# Altium footprint library ST封装.PcbLib: 1336 footprints (part 86 of 109) (continued)
## SQFP28X40-440(N) [mm] (continued)
Top Overlay:
  lines w0.2: -0.4,-39.3 -0.4,-40.45 0.75,-40.45 ; -0.4,0.6 -0.4,0.95 0.4,1.75 0.75,1.75 ; 28.65,-40.45 29.8,-40.45 29.8,-39.3 ; 28.65,1.75 29.8,1.75 29.8,0.6

## SQFP28X40-440(T) [mm]
pads (440):
  rect 0.2x1.6 smd: 1(0,0)
  oval 0.2x1.6 smd: 2(-0.3,0) 3(-0.6,0) 4(-0.9,0) 5(-1.2,0) 6(-1.5,0) 7(-1.8,0) 8(-2.1,0) 9(-2.4,0) 10(-2.7,0) 11(-3,0) 12(-3.3,0) 13(-3.6,0) 14(-3.9,0) 15(-4.2,0) 16(-4.5,0) 17(-4.8,0) 18(-5.1,0) 19(-5.4,0) 20(-5.7,0) 21(-6,0) 22(-6.3,0) 23(-6.6,0) 24(-6.9,0) 25(-7.2,0) 26(-7.5,0) 27(-7.8,0) 28(-8.1,0) 29(-8.4,0) 30(-8.7,0) 31(-9,0) 32(-9.3,0) 33(-9.6,0) 34(-9.9,0) 35(-10.2,0) 36(-10.5,0) 37(-10.8,0) 38(-11.1,0) 39(-11.4,0) 40(-11.7,0) 41(-12,0) 42(-12.3,0) 43(-12.6,0) 44(-12.9,0) 45(-13.2,0) 176(-13.2,-41.4) 177(-12.9,-41.4) 178(-12.6,-41.4) 179(-12.3,-41.4) 180(-12,-41.4) 181(-11.7,-41.4) 182(-11.4,-41.4) 183(-11.1,-41.4) 184(-10.8,-41.4) 185(-10.5,-41.4) 186(-10.2,-41.4) 187(-9.9,-41.4) 188(-9.6,-41.4) 189(-9.3,-41.4) 190(-9,-41.4) 191(-8.7,-41.4) 192(-8.4,-41.4) 193(-8.1,-41.4) 194(-7.8,-41.4) 195(-7.5,-41.4) 196(-7.2,-41.4) 197(-6.9,-41.4) 198(-6.6,-41.4) 199(-6.3,-41.4) 200(-6,-41.4) 201(-5.7,-41.4) 202(-5.4,-41.4) 203(-5.1,-41.4) 204(-4.8,-41.4) 205(-4.5,-41.4) 206(-4.2,-41.4) 207(-3.9,-41.4) 208(-3.6,-41.4) 209(-3.3,-41.4) 210(-3,-41.4) 211(-2.7,-41.4) 212(-2.4,-41.4) 213(-2.1,-41.4) 214(-1.8,-41.4) 215(-1.5,-41.4) 216(-1.2,-41.4) 217(-0.9,-41.4) 218(-0.6,-41.4) 219(-0.3,-41.4) 220(0,-41.4) 221(0.3,-41.4) 222(0.6,-41.4) 223(0.9,-41.4) 224(1.2,-41.4) 225(1.5,-41.4) 226(1.8,-41.4) 227(2.1,-41.4) 228(2.4,-41.4) 229(2.7,-41.4) 230(3,-41.4) 231(3.3,-41.4) 232(3.6,-41.4) 233(3.9,-41.4) 234(4.2,-41.4) 235(4.5,-41.4) 236(4.8,-41.4) 237(5.1,-41.4) 238(5.4,-41.4) 239(5.7,-41.4) 240(6,-41.4) 241(6.3,-41.4) 242(6.6,-41.4) 243(6.9,-41.4) 244(7.2,-41.4) 245(7.5,-41.4) 246(7.8,-41.4) 247(8.1,-41.4) 248(8.4,-41.4) 249(8.7,-41.4) 250(9,-41.4) 251(9.3,-41.4) 252(9.6,-41.4) 253(9.9,-41.4) 254(10.2,-41.4) 255(10.5,-41.4) 256(10.8,-41.4) 257(11.1,-41.4) 258(11.4,-41.4) 259(11.7,-41.4) 260(12,-41.4) 261(12.3,-41.4) 262(12.6,-41.4) 263(12.9,-41.4) 264(13.2,-41.4) 265(13.5,-41.4) 396(13.5,0) 397(13.2,0) 398(12.9,0) 399(12.6,0) 400(12.3,0) 401(12,0) 402(11.7,0) 403(11.4,0) 404(11.1,0) 405(10.8,0) 406(10.5,0) 407(10.2,0) 408(9.9,0) 409(9.6,0) 410(9.3,0) 411(9,0) 412(8.7,0) 413(8.4,0) 414(8.1,0) 415(7.8,0) 416(7.5,0) 417(7.2,0) 418(6.9,0) 419(6.6,0) 420(6.3,0) 421(6,0) 422(5.7,0) 423(5.4,0) 424(5.1,0) 425(4.8,0) 426(4.5,0) 427(4.2,0) 428(3.9,0) 429(3.6,0) 430(3.3,0) 431(3,0) 432(2.7,0) 433(2.4,0) 434(2.1,0) 435(1.8,0) 436(1.5,0) 437(1.2,0) 438(0.9,0) 439(0.6,0) 440(0.3,0)
  oval 1.6x0.2 smd: 46(-14.55,-1.35) 47(-14.55,-1.65) 48(-14.55,-1.95) 49(-14.55,-2.25) 50(-14.55,-2.55) 51(-14.55,-2.85) 52(-14.55,-3.15) 53(-14.55,-3.45) 54(-14.55,-3.75) 55(-14.55,-4.05) 56(-14.55,-4.35) 57(-14.55,-4.65) 58(-14.55,-4.95) 59(-14.55,-5.25) 60(-14.55,-5.55) 61(-14.55,-5.85) 62(-14.55,-6.15) 63(-14.55,-6.45) 64(-14.55,-6.75) 65(-14.55,-7.05) 66(-14.55,-7.35) 67(-14.55,-7.65) 68(-14.55,-7.95) 69(-14.55,-8.25) 70(-14.55,-8.55) 71(-14.55,-8.85) 72(-14.55,-9.15) 73(-14.55,-9.45) 74(-14.55,-9.75) 75(-14.55,-10.05) 76(-14.55,-10.35) 77(-14.55,-10.65) 78(-14.55,-10.95) 79(-14.55,-11.25) 80(-14.55,-11.55) 81(-14.55,-11.85) 82(-14.55,-12.15) 83(-14.55,-12.45) 84(-14.55,-12.75) 85(-14.55,-13.05) 86(-14.55,-13.35) 87(-14.55,-13.65) 88(-14.55,-13.95) 89(-14.55,-14.25) 90(-14.55,-14.55) 91(-14.55,-14.85) 92(-14.55,-15.15) 93(-14.55,-15.45) 94(-14.55,-15.75) 95(-14.55,-16.05) 96(-14.55,-16.35) 97(-14.55,-16.65) 98(-14.55,-16.95) 99(-14.55,-17.25) 100(-14.55,-17.55) 101(-14.55,-17.85) 102(-14.55,-18.15) 103(-14.55,-18.45) 104(-14.55,-18.75) 105(-14.55,-19.05) 106(-14.55,-19.35) 107(-14.55,-19.65) 108(-14.55,-19.95) 109(-14.55,-20.25) 110(-14.55,-20.55) 111(-14.55,-20.85) 112(-14.55,-21.15) 113(-14.55,-21.45) 114(-14.55,-21.75) 115(-14.55,-22.05) 116(-14.55,-22.35) 117(-14.55,-22.65) 118(-14.55,-22.95) 119(-14.55,-23.25) 120(-14.55,-23.55) 121(-14.55,-23.85) 122(-14.55,-24.15) 123(-14.55,-24.45) 124(-14.55,-24.75) 125(-14.55,-25.05) 126(-14.55,-25.35) 127(-14.55,-25.65) 128(-14.55,-25.95) 129(-14.55,-26.25) 130(-14.55,-26.55) 131(-14.55,-26.85) 132(-14.55,-27.15) 133(-14.55,-27.45) 134(-14.55,-27.75) 135(-14.55,-28.05) 136(-14.55,-28.35) 137(-14.55,-28.65) 138(-14.55,-28.95) 139(-14.55,-29.25) 140(-14.55,-29.55) 141(-14.55,-29.85) 142(-14.55,-30.15) 143(-14.55,-30.45) 144(-14.55,-30.75) 145(-14.55,-31.05) 146(-14.55,-31.35) 147(-14.55,-31.65) 148(-14.55,-31.95) 149(-14.55,-32.25) 150(-14.55,-32.55) 151(-14.55,-32.85) 152(-14.55,-33.15) 153(-14.55,-33.45) 154(-14.55,-33.75) 155(-14.55,-34.05) 156(-14.55,-34.35) 157(-14.55,-34.65) 158(-14.55,-34.95) 159(-14.55,-35.25) 160(-14.55,-35.55) 161(-14.55,-35.85) 162(-14.55,-36.15) 163(-14.55,-36.45) 164(-14.55,-36.75) 165(-14.55,-37.05) 166(-14.55,-37.35) 167(-14.55,-37.65) 168(-14.55,-37.95) 169(-14.55,-38.25) 170(-14.55,-38.55) 171(-14.55,-38.85) 172(-14.55,-39.15) 173(-14.55,-39.45) 174(-14.55,-39.75) 175(-14.55,-40.05) 266(14.85,-40.05) 267(14.85,-39.75) 268(14.85,-39.45) 269(14.85,-39.15) 270(14.85,-38.85) 271(14.85,-38.55) 272(14.85,-38.25) 273(14.85,-37.95) 274(14.85,-37.65) 275(14.85,-37.35) 276(14.85,-37.05) 277(14.85,-36.75) 278(14.85,-36.45) 279(14.85,-36.15) 280(14.85,-35.85) 281(14.85,-35.55) 282(14.85,-35.25) 283(14.85,-34.95) 284(14.85,-34.65) 285(14.85,-34.35) 286(14.85,-34.05) 287(14.85,-33.75) 288(14.85,-33.45) 289(14.85,-33.15) 290(14.85,-32.85) 291(14.85,-32.55) 292(14.85,-32.25) 293(14.85,-31.95) 294(14.85,-31.65) 295(14.85,-31.35) 296(14.85,-31.05) 297(14.85,-30.75) 298(14.85,-30.45) 299(14.85,-30.15) 300(14.85,-29.85) 301(14.85,-29.55) 302(14.85,-29.25) 303(14.85,-28.95) 304(14.85,-28.65) 305(14.85,-28.35) 306(14.85,-28.05) 307(14.85,-27.75) 308(14.85,-27.45) 309(14.85,-27.15) 310(14.85,-26.85) 311(14.85,-26.55) 312(14.85,-26.25) 313(14.85,-25.95) 314(14.85,-25.65) 315(14.85,-25.35) 316(14.85,-25.05) 317(14.85,-24.75) 318(14.85,-24.45) 319(14.85,-24.15) 320(14.85,-23.85) 321(14.85,-23.55) 322(14.85,-23.25) 323(14.85,-22.95) 324(14.85,-22.65) 325(14.85,-22.35) 326(14.85,-22.05) 327(14.85,-21.75) 328(14.85,-21.45) 329(14.85,-21.15) 330(14.85,-20.85) 331(14.85,-20.55) 332(14.85,-20.25) 333(14.85,-19.95) 334(14.85,-19.65) 335(14.85,-19.35) 336(14.85,-19.05) 337(14.85,-18.75) 338(14.85,-18.45) 339(14.85,-18.15) 340(14.85,-17.85) 341(14.85,-17.55) 342(14.85,-17.25) 343(14.85,-16.95) 344(14.85,-16.65) 345(14.85,-16.35) 346(14.85,-16.05) 347(14.85,-15.75) 348(14.85,-15.45) 349(14.85,-15.15) 350(14.85,-14.85) 351(14.85,-14.55) 352(14.85,-14.25) 353(14.85,-13.95) 354(14.85,-13.65) 355(14.85,-13.35) 356(14.85,-13.05) 357(14.85,-12.75) 358(14.85,-12.45) 359(14.85,-12.15) 360(14.85,-11.85) 361(14.85,-11.55) 362(14.85,-11.25) 363(14.85,-10.95) 364(14.85,-10.65) 365(14.85,-10.35) 366(14.85,-10.05) 367(14.85,-9.75) 368(14.85,-9.45) 369(14.85,-9.15) 370(14.85,-8.85) 371(14.85,-8.55) 372(14.85,-8.25) 373(14.85,-7.95) 374(14.85,-7.65) 375(14.85,-7.35) 376(14.85,-7.05) 377(14.85,-6.75) 378(14.85,-6.45) 379(14.85,-6.15) 380(14.85,-5.85) 381(14.85,-5.55) 382(14.85,-5.25) 383(14.85,-4.95) 384(14.85,-4.65) 385(14.85,-4.35) 386(14.85,-4.05) 387(14.85,-3.75) 388(14.85,-3.45) 389(14.85,-3.15) 390(14.85,-2.85) 391(14.85,-2.55) 392(14.85,-2.25) 393(14.85,-1.95) 394(14.85,-1.65) 395(14.85,-1.35)
Top Overlay:
  lines w0.2: -14.95,-40.65 -14.95,-41.8 -13.8,-41.8 ; -14.95,-0.75 -14.95,-0.4 -14.15,0.4 -13.8,0.4 ; 14.1,-41.8 15.25,-41.8 15.25,-40.65 ; 14.1,0.4 15.25,0.4 15.25,-0.75

## SQFP32X32-240(N) [mm]
pads (240):
  rect 1.6x0.4 smd: 1(0,0)
  oval 1.6x0.4 smd: 2(0,-0.5) 3(0,-1) 4(0,-1.5) 5(0,-2) 6(0,-2.5) 7(0,-3) 8(0,-3.5) 9(0,-4) 10(0,-4.5) 11(0,-5) 12(0,-5.5) 13(0,-6) 14(0,-6.5) 15(0,-7) 16(0,-7.5) 17(0,-8) 18(0,-8.5) 19(0,-9) 20(0,-9.5) 21(0,-10) 22(0,-10.5) 23(0,-11) 24(0,-11.5) 25(0,-12) 26(0,-12.5) 27(0,-13) 28(0,-13.5) 29(0,-14) 30(0,-14.5) 31(0,-15) 32(0,-15.5) 33(0,-16) 34(0,-16.5) 35(0,-17) 36(0,-17.5) 37(0,-18) 38(0,-18.5) 39(0,-19) 40(0,-19.5) 41(0,-20) 42(0,-20.5) 43(0,-21) 44(0,-21.5) 45(0,-22) 46(0,-22.5) 47(0,-23) 48(0,-23.5) 49(0,-24) 50(0,-24.5) 51(0,-25) 52(0,-25.5) 53(0,-26) 54(0,-26.5) 55(0,-27) 56(0,-27.5) 57(0,-28) 58(0,-28.5) 59(0,-29) 60(0,-29.5) 121(33.4,-29.5) 122(33.4,-29) 123(33.4,-28.5) 124(33.4,-28) 125(33.4,-27.5) 126(33.4,-27) 127(33.4,-26.5) 128(33.4,-26) 129(33.4,-25.5) 130(33.4,-25) 131(33.4,-24.5) 132(33.4,-24) 133(33.4,-23.5) 134(33.4,-23) 135(33.4,-22.5) 136(33.4,-22) 137(33.4,-21.5) 138(33.4,-21) 139(33.4,-20.5) 140(33.4,-20) 141(33.4,-19.5) 142(33.4,-19) 143(33.4,-18.5) 144(33.4,-18) 145(33.4,-17.5) 146(33.4,-17) 147(33.4,-16.5) 148(33.4,-16) 149(33.4,-15.5) 150(33.4,-15) 151(33.4,-14.5) 152(33.4,-14) 153(33.4,-13.5) 154(33.4,-13) 155(33.4,-12.5) 156(33.4,-12) 157(33.4,-11.5) 158(33.4,-11) 159(33.4,-10.5) 160(33.4,-10) 161(33.4,-9.5) 162(33.4,-9) 163(33.4,-8.5) 164(33.4,-8) 165(33.4,-7.5) 166(33.4,-7) 167(33.4,-6.5) 168(33.4,-6) 169(33.4,-5.5) 170(33.4,-5) 171(33.4,-4.5) 172(33.4,-4) 173(33.4,-3.5) 174(33.4,-3) 175(33.4,-2.5) 176(33.4,-2) 177(33.4,-1.5) 178(33.4,-1) 179(33.4,-0.5) 180(33.4,0)
  oval 0.4x1.6 smd: 61(1.95,-31.45) 62(2.45,-31.45) 63(2.95,-31.45) 64(3.45,-31.45) 65(3.95,-31.45) 66(4.45,-31.45) 67(4.95,-31.45) 68(5.45,-31.45) 69(5.95,-31.45) 70(6.45,-31.45) 71(6.95,-31.45) 72(7.45,-31.45) 73(7.95,-31.45) 74(8.45,-31.45) 75(8.95,-31.45) 76(9.45,-31.45) 77(9.95,-31.45) 78(10.45,-31.45) 79(10.95,-31.45) 80(11.45,-31.45) 81(11.95,-31.45) 82(12.45,-31.45) 83(12.95,-31.45) 84(13.45,-31.45) 85(13.95,-31.45) 86(14.45,-31.45) 87(14.95,-31.45) 88(15.45,-31.45) 89(15.95,-31.45) 90(16.45,-31.45) 91(16.95,-31.45) 92(17.45,-31.45) 93(17.95,-31.45) 94(18.45,-31.45) 95(18.95,-31.45) 96(19.45,-31.45) 97(19.95,-31.45) 98(20.45,-31.45) 99(20.95,-31.45) 100(21.45,-31.45) 101(21.95,-31.45) 102(22.45,-31.45) 103(22.95,-31.45) 104(23.45,-31.45) 105(23.95,-31.45) 106(24.45,-31.45) 107(24.95,-31.45) 108(25.45,-31.45) 109(25.95,-31.45) 110(26.45,-31.45) 111(26.95,-31.45) 112(27.45,-31.45) 113(27.95,-31.45) 114(28.45,-31.45) 115(28.95,-31.45) 116(29.45,-31.45) 117(29.95,-31.45) 118(30.45,-31.45) 119(30.95,-31.45) 120(31.45,-31.45) 181(31.45,1.95) 182(30.95,1.95) 183(30.45,1.95) 184(29.95,1.95) 185(29.45,1.95) 186(28.95,1.95) 187(28.45,1.95) 188(27.95,1.95) 189(27.45,1.95) 190(26.95,1.95) 191(26.45,1.95) 192(25.95,1.95) 193(25.45,1.95) 194(24.95,1.95) 195(24.45,1.95) 196(23.95,1.95) 197(23.45,1.95) 198(22.95,1.95) 199(22.45,1.95) 200(21.95,1.95) 201(21.45,1.95) 202(20.95,1.95) 203(20.45,1.95) 204(19.95,1.95) 205(19.45,1.95) 206(18.95,1.95) 207(18.45,1.95) 208(17.95,1.95) 209(17.45,1.95) 210(16.95,1.95) 211(16.45,1.95) 212(15.95,1.95) 213(15.45,1.95) 214(14.95,1.95) 215(14.45,1.95) 216(13.95,1.95) 217(13.45,1.95) 218(12.95,1.95) 219(12.45,1.95) 220(11.95,1.95) 221(11.45,1.95) 222(10.95,1.95) 223(10.45,1.95) 224(9.95,1.95) 225(9.45,1.95) 226(8.95,1.95) 227(8.45,1.95) 228(7.95,1.95) 229(7.45,1.95) 230(6.95,1.95) 231(6.45,1.95) 232(5.95,1.95) 233(5.45,1.95) 234(4.95,1.95) 235(4.45,1.95) 236(3.95,1.95) 237(3.45,1.95) 238(2.95,1.95) 239(2.45,1.95) 240(1.95,1.95)
Top Overlay:
  lines w0.2: -0.4,-30.2 -0.4,-31.85 1.25,-31.85 ; -0.4,0.7 -0.4,1.55 0.4,2.35 1.25,2.35 ; 32.15,-31.85 33.8,-31.85 33.8,-30.2 ; 32.15,2.35 33.8,2.35 33.8,0.7

## SQFP32X32-240(T) [mm]
pads (240):
  rect 0.4x1.6 smd: 1(0,0)
  oval 0.4x1.6 smd: 2(-0.5,0) 3(-1,0) 4(-1.5,0) 5(-2,0) 6(-2.5,0) 7(-3,0) 8(-3.5,0) 9(-4,0) 10(-4.5,0) 11(-5,0) 12(-5.5,0) 13(-6,0) 14(-6.5,0) 15(-7,0) 16(-7.5,0) 17(-8,0) 18(-8.5,0) 19(-9,0) 20(-9.5,0) 21(-10,0) 22(-10.5,0) 23(-11,0) 24(-11.5,0) 25(-12,0) 26(-12.5,0) 27(-13,0) 28(-13.5,0) 29(-14,0) 30(-14.5,0) 91(-14.5,-33.4) 92(-14,-33.4) 93(-13.5,-33.4) 94(-13,-33.4) 95(-12.5,-33.4) 96(-12,-33.4) 97(-11.5,-33.4) 98(-11,-33.4) 99(-10.5,-33.4) 100(-10,-33.4) 101(-9.5,-33.4) 102(-9,-33.4) 103(-8.5,-33.4) 104(-8,-33.4) 105(-7.5,-33.4) 106(-7,-33.4) 107(-6.5,-33.4) 108(-6,-33.4) 109(-5.5,-33.4) 110(-5,-33.4) 111(-4.5,-33.4) 112(-4,-33.4) 113(-3.5,-33.4) 114(-3,-33.4) 115(-2.5,-33.4) 116(-2,-33.4) 117(-1.5,-33.4) 118(-1,-33.4) 119(-0.5,-33.4) 120(0,-33.4) 121(0.5,-33.4) 122(1,-33.4) 123(1.5,-33.4) 124(2,-33.4) 125(2.5,-33.4) 126(3,-33.4) 127(3.5,-33.4) 128(4,-33.4) 129(4.5,-33.4) 130(5,-33.4) 131(5.5,-33.4) 132(6,-33.4) 133(6.5,-33.4) 134(7,-33.4) 135(7.5,-33.4) 136(8,-33.4) 137(8.5,-33.4) 138(9,-33.4) 139(9.5,-33.4) 140(10,-33.4) 141(10.5,-33.4) 142(11,-33.4) 143(11.5,-33.4) 144(12,-33.4) 145(12.5,-33.4) 146(13,-33.4) 147(13.5,-33.4) 148(14,-33.4) 149(14.5,-33.4) 150(15,-33.4) 211(15,0) 212(14.5,0) 213(14,0) 214(13.5,0) 215(13,0) 216(12.5,0) 217(12,0) 218(11.5,0) 219(11,0) 220(10.5,0) 221(10,0) 222(9.5,0) 223(9,0) 224(8.5,0) 225(8,0) 226(7.5,0) 227(7,0) 228(6.5,0) 229(6,0) 230(5.5,0) 231(5,0) 232(4.5,0) 233(4,0) 234(3.5,0) 235(3,0) 236(2.5,0) 237(2,0) 238(1.5,0) 239(1,0) 240(0.5,0)
  oval 1.6x0.4 smd: 31(-16.45,-1.95) 32(-16.45,-2.45) 33(-16.45,-2.95) 34(-16.45,-3.45) 35(-16.45,-3.95) 36(-16.45,-4.45) 37(-16.45,-4.95) 38(-16.45,-5.45) 39(-16.45,-5.95) 40(-16.45,-6.45) 41(-16.45,-6.95) 42(-16.45,-7.45) 43(-16.45,-7.95) 44(-16.45,-8.45) 45(-16.45,-8.95) 46(-16.45,-9.45) 47(-16.45,-9.95) 48(-16.45,-10.45) 49(-16.45,-10.95) 50(-16.45,-11.45) 51(-16.45,-11.95) 52(-16.45,-12.45) 53(-16.45,-12.95) 54(-16.45,-13.45) 55(-16.45,-13.95) 56(-16.45,-14.45) 57(-16.45,-14.95) 58(-16.45,-15.45) 59(-16.45,-15.95) 60(-16.45,-16.45) 61(-16.45,-16.95) 62(-16.45,-17.45) 63(-16.45,-17.95) 64(-16.45,-18.45) 65(-16.45,-18.95) 66(-16.45,-19.45) 67(-16.45,-19.95) 68(-16.45,-20.45) 69(-16.45,-20.95) 70(-16.45,-21.45) 71(-16.45,-21.95) 72(-16.45,-22.45) 73(-16.45,-22.95) 74(-16.45,-23.45) 75(-16.45,-23.95) 76(-16.45,-24.45) 77(-16.45,-24.95) 78(-16.45,-25.45) 79(-16.45,-25.95) 80(-16.45,-26.45) 81(-16.45,-26.95) 82(-16.45,-27.45) 83(-16.45,-27.95) 84(-16.45,-28.45) 85(-16.45,-28.95) 86(-16.45,-29.45) 87(-16.45,-29.95) 88(-16.45,-30.45) 89(-16.45,-30.95) 90(-16.45,-31.45) 151(16.95,-31.45) 152(16.95,-30.95) 153(16.95,-30.45) 154(16.95,-29.95) 155(16.95,-29.45) 156(16.95,-28.95) 157(16.95,-28.45) 158(16.95,-27.95) 159(16.95,-27.45) 160(16.95,-26.95) 161(16.95,-26.45) 162(16.95,-25.95) 163(16.95,-25.45) 164(16.95,-24.95) 165(16.95,-24.45) 166(16.95,-23.95) 167(16.95,-23.45) 168(16.95,-22.95) 169(16.95,-22.45) 170(16.95,-21.95) 171(16.95,-21.45) 172(16.95,-20.95) 173(16.95,-20.45) 174(16.95,-19.95) 175(16.95,-19.45) 176(16.95,-18.95) 177(16.95,-18.45) 178(16.95,-17.95) 179(16.95,-17.45) 180(16.95,-16.95) 181(16.95,-16.45) 182(16.95,-15.95) 183(16.95,-15.45) 184(16.95,-14.95) 185(16.95,-14.45) 186(16.95,-13.95) 187(16.95,-13.45) 188(16.95,-12.95) 189(16.95,-12.45) 190(16.95,-11.95) 191(16.95,-11.45) 192(16.95,-10.95) 193(16.95,-10.45) 194(16.95,-9.95) 195(16.95,-9.45) 196(16.95,-8.95) 197(16.95,-8.45) 198(16.95,-7.95) 199(16.95,-7.45) 200(16.95,-6.95) 201(16.95,-6.45) 202(16.95,-5.95) 203(16.95,-5.45) 204(16.95,-4.95) 205(16.95,-4.45) 206(16.95,-3.95) 207(16.95,-3.45) 208(16.95,-2.95) 209(16.95,-2.45) 210(16.95,-1.95)
Top Overlay:
  lines w0.2: -16.85,-32.15 -16.85,-33.8 -15.2,-33.8 ; -16.85,-1.25 -16.85,-0.4 -16.05,0.4 -15.2,0.4 ; 15.7,-33.8 17.35,-33.8 17.35,-32.15 ; 15.7,0.4 17.35,0.4 17.35,-1.25

## SQFP32X32-248(N) [mm]
pads (248):
  rect 1.6x0.4 smd: 1(0,0)
  oval 1.6x0.4 smd: 2(0,-0.5) 3(0,-1) 4(0,-1.5) 5(0,-2) 6(0,-2.5) 7(0,-3) 8(0,-3.5) 9(0,-4) 10(0,-4.5) 11(0,-5) 12(0,-5.5) 13(0,-6) 14(0,-6.5) 15(0,-7) 16(0,-7.5) 17(0,-8) 18(0,-8.5) 19(0,-9) 20(0,-9.5) 21(0,-10) 22(0,-10.5) 23(0,-11) 24(0,-11.5) 25(0,-12) 26(0,-12.5) 27(0,-13) 28(0,-13.5) 29(0,-14) 30(0,-14.5) 31(0,-15) 32(0,-15.5) 33(0,-16) 34(0,-16.5) 35(0,-17) 36(0,-17.5) 37(0,-18) 38(0,-18.5) 39(0,-19) 40(0,-19.5) 41(0,-20) 42(0,-20.5) 43(0,-21) 44(0,-21.5) 45(0,-22) 46(0,-22.5) 47(0,-23) 48(0,-23.5) 49(0,-24) 50(0,-24.5) 51(0,-25) 52(0,-25.5) 53(0,-26) 54(0,-26.5) 55(0,-27) 56(0,-27.5) 57(0,-28) 58(0,-28.5) 59(0,-29) 60(0,-29.5) 61(0,-30) 62(0,-30.5) 125(33.4,-30.5) 126(33.4,-30) 127(33.4,-29.5) 128(33.4,-29) 129(33.4,-28.5) 130(33.4,-28) 131(33.4,-27.5) 132(33.4,-27) 133(33.4,-26.5) 134(33.4,-26) 135(33.4,-25.5) 136(33.4,-25) 137(33.4,-24.5) 138(33.4,-24) 139(33.4,-23.5) 140(33.4,-23) 141(33.4,-22.5) 142(33.4,-22) 143(33.4,-21.5) 144(33.4,-21) 145(33.4,-20.5) 146(33.4,-20) 147(33.4,-19.5) 148(33.4,-19) 149(33.4,-18.5) 150(33.4,-18) 151(33.4,-17.5) 152(33.4,-17) 153(33.4,-16.5) 154(33.4,-16) 155(33.4,-15.5) 156(33.4,-15) 157(33.4,-14.5) 158(33.4,-14) 159(33.4,-13.5) 160(33.4,-13) 161(33.4,-12.5) 162(33.4,-12) 163(33.4,-11.5) 164(33.4,-11) 165(33.4,-10.5) 166(33.4,-10) 167(33.4,-9.5) 168(33.4,-9) 169(33.4,-8.5) 170(33.4,-8) 171(33.4,-7.5) 172(33.4,-7) 173(33.4,-6.5) 174(33.4,-6) 175(33.4,-5.5) 176(33.4,-5) 177(33.4,-4.5) 178(33.4,-4) 179(33.4,-3.5) 180(33.4,-3) 181(33.4,-2.5) 182(33.4,-2) 183(33.4,-1.5) 184(33.4,-1) 185(33.4,-0.5) 186(33.4,0)
  oval 0.4x1.6 smd: 63(1.45,-31.95) 64(1.95,-31.95) 65(2.45,-31.95) 66(2.95,-31.95) 67(3.45,-31.95) 68(3.95,-31.95) 69(4.45,-31.95) 70(4.95,-31.95) 71(5.45,-31.95) 72(5.95,-31.95) 73(6.45,-31.95) 74(6.95,-31.95) 75(7.45,-31.95) 76(7.95,-31.95) 77(8.45,-31.95) 78(8.95,-31.95) 79(9.45,-31.95) 80(9.95,-31.95) 81(10.45,-31.95) 82(10.95,-31.95) 83(11.45,-31.95) 84(11.95,-31.95) 85(12.45,-31.95) 86(12.95,-31.95) 87(13.45,-31.95) 88(13.95,-31.95) 89(14.45,-31.95) 90(14.95,-31.95) 91(15.45,-31.95) 92(15.95,-31.95) 93(16.45,-31.95) 94(16.95,-31.95) 95(17.45,-31.95) 96(17.95,-31.95) 97(18.45,-31.95) 98(18.95,-31.95) 99(19.45,-31.95) 100(19.95,-31.95) 101(20.45,-31.95) 102(20.95,-31.95) 103(21.45,-31.95) 104(21.95,-31.95) 105(22.45,-31.95) 106(22.95,-31.95) 107(23.45,-31.95) 108(23.95,-31.95) 109(24.45,-31.95) 110(24.95,-31.95) 111(25.45,-31.95) 112(25.95,-31.95) 113(26.45,-31.95) 114(26.95,-31.95) 115(27.45,-31.95) 116(27.95,-31.95) 117(28.45,-31.95) 118(28.95,-31.95) 119(29.45,-31.95) 120(29.95,-31.95) 121(30.45,-31.95) 122(30.95,-31.95) 123(31.45,-31.95) 124(31.95,-31.95) 187(31.95,1.45) 188(31.45,1.45) 189(30.95,1.45) 190(30.45,1.45) 191(29.95,1.45) 192(29.45,1.45) 193(28.95,1.45) 194(28.45,1.45) 195(27.95,1.45) 196(27.45,1.45) 197(26.95,1.45) 198(26.45,1.45) 199(25.95,1.45) 200(25.45,1.45) 201(24.95,1.45) 202(24.45,1.45) 203(23.95,1.45) 204(23.45,1.45) 205(22.95,1.45) 206(22.45,1.45) 207(21.95,1.45) 208(21.45,1.45) 209(20.95,1.45) 210(20.45,1.45) 211(19.95,1.45) 212(19.45,1.45) 213(18.95,1.45) 214(18.45,1.45) 215(17.95,1.45) 216(17.45,1.45) 217(16.95,1.45) 218(16.45,1.45) 219(15.95,1.45) 220(15.45,1.45) 221(14.95,1.45) 222(14.45,1.45) 223(13.95,1.45) 224(13.45,1.45) 225(12.95,1.45) 226(12.45,1.45) 227(11.95,1.45) 228(11.45,1.45) 229(10.95,1.45) 230(10.45,1.45) 231(9.95,1.45) 232(9.45,1.45) 233(8.95,1.45) 234(8.45,1.45) 235(7.95,1.45) 236(7.45,1.45) 237(6.95,1.45) 238(6.45,1.45) 239(5.95,1.45) 240(5.45,1.45) 241(4.95,1.45) 242(4.45,1.45) 243(3.95,1.45) 244(3.45,1.45) 245(2.95,1.45) 246(2.45,1.45) 247(1.95,1.45) 248(1.45,1.45)
Top Overlay:
  lines w0.2: -0.4,-31.2 -0.4,-32.35 0.75,-32.35 ; -0.4,0.7 -0.4,1.05 0.4,1.85 0.75,1.85 ; 32.65,-32.35 33.8,-32.35 33.8,-31.2 ; 32.65,1.85 33.8,1.85 33.8,0.7

## SQFP32X32-248(T) [mm]
pads (248):
  rect 0.4x1.6 smd: 1(0,0)
  oval 0.4x1.6 smd: 2(-0.5,0) 3(-1,0) 4(-1.5,0) 5(-2,0) 6(-2.5,0) 7(-3,0) 8(-3.5,0) 9(-4,0) 10(-4.5,0) 11(-5,0) 12(-5.5,0) 13(-6,0) 14(-6.5,0) 15(-7,0) 16(-7.5,0) 17(-8,0) 18(-8.5,0) 19(-9,0) 20(-9.5,0) 21(-10,0) 22(-10.5,0) 23(-11,0) 24(-11.5,0) 25(-12,0) 26(-12.5,0) 27(-13,0) 28(-13.5,0) 29(-14,0) 30(-14.5,0) 31(-15,0) 94(-15,-33.4) 95(-14.5,-33.4) 96(-14,-33.4) 97(-13.5,-33.4) 98(-13,-33.4) 99(-12.5,-33.4) 100(-12,-33.4) 101(-11.5,-33.4) 102(-11,-33.4) 103(-10.5,-33.4) 104(-10,-33.4) 105(-9.5,-33.4) 106(-9,-33.4) 107(-8.5,-33.4) 108(-8,-33.4) 109(-7.5,-33.4) 110(-7,-33.4) 111(-6.5,-33.4) 112(-6,-33.4) 113(-5.5,-33.4) 114(-5,-33.4) 115(-4.5,-33.4) 116(-4,-33.4) 117(-3.5,-33.4) 118(-3,-33.4) 119(-2.5,-33.4) 120(-2,-33.4) 121(-1.5,-33.4) 122(-1,-33.4) 123(-0.5,-33.4) 124(0,-33.4) 125(0.5,-33.4) 126(1,-33.4) 127(1.5,-33.4) 128(2,-33.4) 129(2.5,-33.4) 130(3,-33.4) 131(3.5,-33.4) 132(4,-33.4) 133(4.5,-33.4) 134(5,-33.4) 135(5.5,-33.4) 136(6,-33.4) 137(6.5,-33.4) 138(7,-33.4) 139(7.5,-33.4) 140(8,-33.4) 141(8.5,-33.4) 142(9,-33.4) 143(9.5,-33.4) 144(10,-33.4) 145(10.5,-33.4) 146(11,-33.4) 147(11.5,-33.4) 148(12,-33.4) 149(12.5,-33.4) 150(13,-33.4) 151(13.5,-33.4) 152(14,-33.4) 153(14.5,-33.4) 154(15,-33.4) 155(15.5,-33.4) 218(15.5,0) 219(15,0) 220(14.5,0) 221(14,0) 222(13.5,0) 223(13,0) 224(12.5,0) 225(12,0) 226(11.5,0) 227(11,0) 228(10.5,0) 229(10,0) 230(9.5,0) 231(9,0) 232(8.5,0) 233(8,0) 234(7.5,0) 235(7,0) 236(6.5,0) 237(6,0) 238(5.5,0) 239(5,0) 240(4.5,0) 241(4,0) 242(3.5,0) 243(3,0) 244(2.5,0) 245(2,0) 246(1.5,0) 247(1,0) 248(0.5,0)
  oval 1.6x0.4 smd: 32(-16.45,-1.45) 33(-16.45,-1.95) 34(-16.45,-2.45) 35(-16.45,-2.95) 36(-16.45,-3.45) 37(-16.45,-3.95) 38(-16.45,-4.45) 39(-16.45,-4.95) 40(-16.45,-5.45) 41(-16.45,-5.95) 42(-16.45,-6.45) 43(-16.45,-6.95) 44(-16.45,-7.45) 45(-16.45,-7.95) 46(-16.45,-8.45) 47(-16.45,-8.95) 48(-16.45,-9.45) 49(-16.45,-9.95) 50(-16.45,-10.45) 51(-16.45,-10.95) 52(-16.45,-11.45) 53(-16.45,-11.95) 54(-16.45,-12.45) 55(-16.45,-12.95) 56(-16.45,-13.45) 57(-16.45,-13.95) 58(-16.45,-14.45) 59(-16.45,-14.95) 60(-16.45,-15.45) 61(-16.45,-15.95) 62(-16.45,-16.45) 63(-16.45,-16.95) 64(-16.45,-17.45) 65(-16.45,-17.95) 66(-16.45,-18.45) 67(-16.45,-18.95) 68(-16.45,-19.45) 69(-16.45,-19.95) 70(-16.45,-20.45) 71(-16.45,-20.95) 72(-16.45,-21.45) 73(-16.45,-21.95) 74(-16.45,-22.45) 75(-16.45,-22.95) 76(-16.45,-23.45) 77(-16.45,-23.95) 78(-16.45,-24.45) 79(-16.45,-24.95) 80(-16.45,-25.45) 81(-16.45,-25.95) 82(-16.45,-26.45) 83(-16.45,-26.95) 84(-16.45,-27.45) 85(-16.45,-27.95) 86(-16.45,-28.45) 87(-16.45,-28.95) 88(-16.45,-29.45) 89(-16.45,-29.95) 90(-16.45,-30.45) 91(-16.45,-30.95) 92(-16.45,-31.45) 93(-16.45,-31.95) 156(16.95,-31.95) 157(16.95,-31.45) 158(16.95,-30.95) 159(16.95,-30.45) 160(16.95,-29.95) 161(16.95,-29.45) 162(16.95,-28.95) 163(16.95,-28.45) 164(16.95,-27.95) 165(16.95,-27.45) 166(16.95,-26.95) 167(16.95,-26.45) 168(16.95,-25.95) 169(16.95,-25.45) 170(16.95,-24.95) 171(16.95,-24.45) 172(16.95,-23.95) 173(16.95,-23.45) 174(16.95,-22.95) 175(16.95,-22.45) 176(16.95,-21.95) 177(16.95,-21.45) 178(16.95,-20.95) 179(16.95,-20.45) 180(16.95,-19.95) 181(16.95,-19.45) 182(16.95,-18.95) 183(16.95,-18.45) 184(16.95,-17.95) 185(16.95,-17.45) 186(16.95,-16.95) 187(16.95,-16.45) 188(16.95,-15.95) 189(16.95,-15.45) 190(16.95,-14.95) 191(16.95,-14.45) 192(16.95,-13.95) 193(16.95,-13.45) 194(16.95,-12.95) 195(16.95,-12.45) 196(16.95,-11.95) 197(16.95,-11.45) 198(16.95,-10.95) 199(16.95,-10.45) 200(16.95,-9.95) 201(16.95,-9.45) 202(16.95,-8.95) 203(16.95,-8.45) 204(16.95,-7.95) 205(16.95,-7.45) 206(16.95,-6.95) 207(16.95,-6.45) 208(16.95,-5.95) 209(16.95,-5.45) 210(16.95,-4.95) 211(16.95,-4.45) 212(16.95,-3.95) 213(16.95,-3.45) 214(16.95,-2.95) 215(16.95,-2.45) 216(16.95,-1.95) 217(16.95,-1.45)
Top Overlay:
  lines w0.2: -16.85,-32.65 -16.85,-33.8 -15.7,-33.8 ; -16.85,-0.75 -16.85,-0.4 -16.05,0.4 -15.7,0.4 ; 16.2,-33.8 17.35,-33.8 17.35,-32.65 ; 16.2,0.4 17.35,0.4 17.35,-0.75